# Altium footprint library Dahlia Carrier Board.PcbLib: 99 footprints (part 3 of 7)
Each footprint in its own frame and in the unit in brackets; x right, y up, seen from the top. Pads: shape width x height; smd on the part's side, far side on the other; paste and mask are expansions set on the pad; w line width, h text height; cw(c..) or ccw(c..) is an arc to the next point about the centre after c.
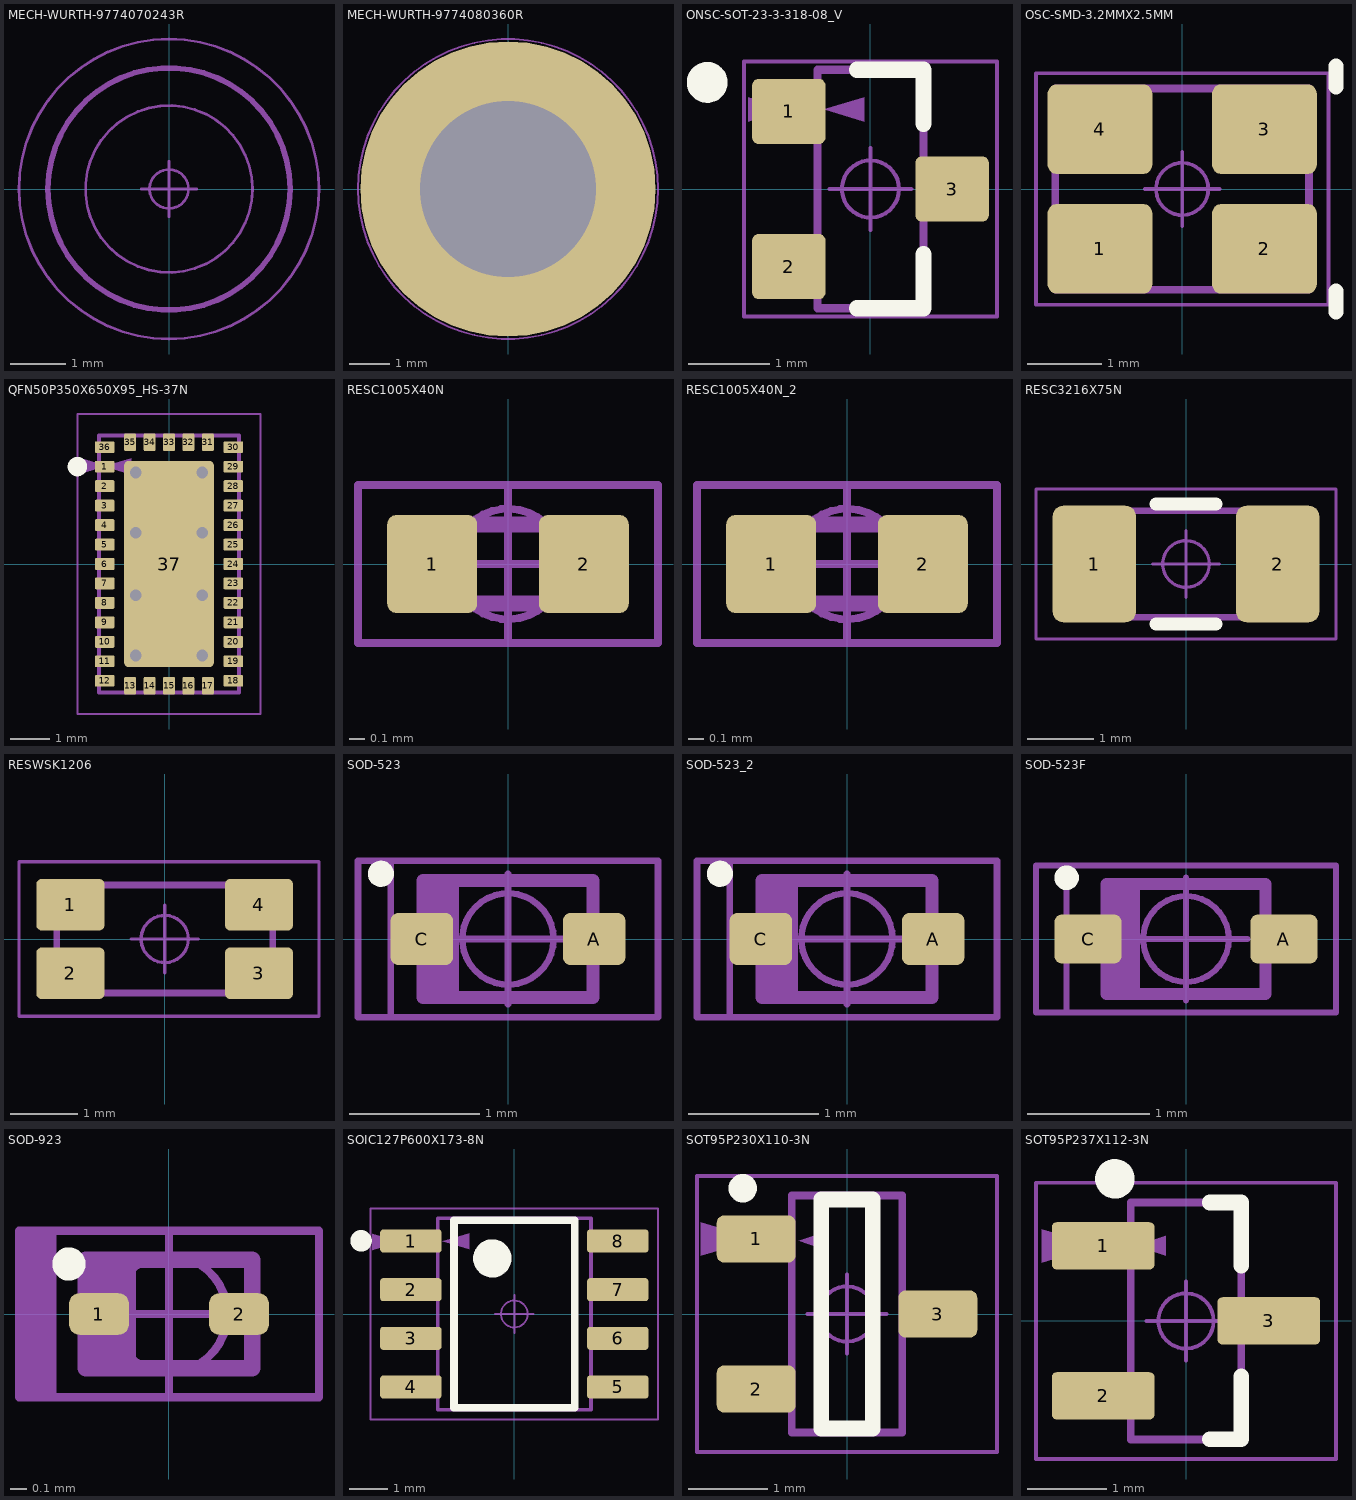
[diagram p2: the footprints below, top view; thin cyan lines are the x and y axes]

## MECH-WURTH-9774070243R [mm]
Top Component Outline:
  circle w0.05: c0,0 r2.693
  circle w0.05: c0,0 r1.499
  circle w0.05: c0,0 r2.693
  circle w0.05: c0,0 r1.499
Top 3D Body:
  circle w0.001: c0,0 r2.175
  circle w0.001: c0,0 r2.175
Top Dimensions:
  circle w0.1: c0,0 r2.175
Top Component Center:
  circle w0.05: c0,0 r0.35
  lines w0.05: -0.5,0 0.5,0 ; 0,-0.5 0,0.5
Top Assembly:
  text ".Designator" at -1.321,-0.152 h0.75
3D body "9774070243R (rev1).stp": height 7.01, standoff -1.39, extent -2.175,-2.172 2.175,2.172

## MECH-WURTH-9774080360R [mm]
pads (1):
  round 7.4 / inner round 0 / far side round 0 hole 4.4 unplated: ""(0,0)
Top Paste:
  region: 2.214,-0.4 2.177,-0.567 2.067,-0.889 1.909,-1.191 1.707,-1.466 1.466,-1.707 1.191,-1.909 0.889,-2.067 0.567,-2.177 0.4,-2.214 0.4,-3.628 0.604,-3.605 1.004,-3.514 1.391,-3.379 1.761,-3.2 2.108,-2.982 2.428,-2.725 2.717,-2.434 2.971,-2.112 3.188,-1.763 3.363,-1.393 3.496,-1.005 3.584,-0.604 3.606,-0.4
  region: 0.4,2.214 0.567,2.177 0.889,2.067 1.191,1.909 1.466,1.707 1.707,1.466 1.909,1.191 2.067,0.889 2.177,0.567 2.214,0.4 3.628,0.4 3.605,0.604 3.514,1.004 3.379,1.391 3.2,1.761 2.982,2.108 2.725,2.428 2.434,2.717 2.112,2.971 1.763,3.188 1.393,3.363 1.005,3.496 0.604,3.584 0.4,3.606
  region: -0.4,-2.214 -0.567,-2.177 -0.889,-2.067 -1.191,-1.909 -1.466,-1.707 -1.707,-1.466 -1.909,-1.191 -2.067,-0.889 -2.177,-0.567 -2.214,-0.4 -3.628,-0.4 -3.605,-0.604 -3.514,-1.004 -3.379,-1.391 -3.2,-1.761 -2.982,-2.108 -2.725,-2.428 -2.434,-2.717 -2.112,-2.971 -1.763,-3.188 -1.393,-3.363 -1.005,-3.496 -0.604,-3.584 -0.4,-3.606
  region: -2.214,0.4 -2.177,0.567 -2.067,0.889 -1.909,1.191 -1.707,1.466 -1.466,1.707 -1.191,1.909 -0.889,2.067 -0.567,2.177 -0.4,2.214 -0.4,3.628 -0.604,3.605 -1.004,3.514 -1.391,3.379 -1.761,3.2 -2.108,2.982 -2.428,2.725 -2.717,2.434 -2.971,2.112 -3.188,1.763 -3.363,1.393 -3.496,1.005 -3.584,0.604 -3.606,0.4
Top Component Outline:
  circle w0.05: c0,0 r3.759
  circle w0.05: c0,0 r2.219
Top 3D Body:
  circle w0.001: c0,0 r3
Top Dimensions:
  circle w0.1: c0,0 r3
Top Component Center:
  circle w0.05: c0,0 r0.35
  lines w0.05: -0.5,0 0.5,0 ; 0,-0.5 0,0.5
Top Assembly:
  text ".Designator" at -1.346,-0.152 h0.75
Bottom 3D Body:
  circle w0.1: c0,0 r2.24
  circle w0.1: c0,0 r3.635
3D body "9774080360R (rev1).stp": height 8, standoff -1.4, extent -3,-3 3,3

## ONSC-SOT-23-3-318-08_V [mm]
height 5.5
pads (3):
  rrect20% 0.9x0.8 smd: 1(-1,0.95) 2(-1,-0.95) 3(1,0)
Top Overlay:
  circle w0.25: c-2,1.306 r0.125
  lines w0.2: -0.165,-1.46 0.65,-1.46 0.65,-0.8 ; -0.165,1.46 0.65,1.46 0.65,0.8
Top Component Outline:
  region: -1.5,0.825 -1,0.975 -1.5,1.125
  lines w0.05: -1.55,-1.56 -1.55,1.56 1.55,1.56 1.55,-1.56 -1.55,-1.56
Top 3D Body:
  lines w0.001: -0.65,-1.46 0.65,-1.46 0.65,1.46 -0.65,1.46 -0.65,-1.46
Top Dimensions:
  region: -0.075,1.125 -0.575,0.975 -0.075,0.825
  lines w0.1: -0.65,-1.46 0.65,-1.46 0.65,1.46 -0.65,1.46 -0.65,-1.46
Top Component Center:
  circle w0.05: c0,0 r0.35
  lines w0.05: -0.5,0 0.5,0 ; 0,-0.5 0,0.5
Top Assembly:
  text ".Designator" at -1.55,1.85 h0.75
3D body "User Library-SOT-23-2.STEP": height 1.08, standoff 0, extent -1.32,-1.5 1.32,1.5

## OSC-SMD-3.2MMX2.5MM [mm]
height 5.5
pads (4):
  rrect20% 1.4x1.2 smd: 1(-1.1,-0.8) 2(1.1,-0.8) 3(1.1,0.8) 4(-1.1,0.8)
Top Overlay:
  lines w0.2: 2.057,-1.645 2.057,-1.364 ; 2.057,1.366 2.057,1.645
Top Component Outline:
  lines w0.05: -1.956,-1.549 1.956,-1.549 1.956,1.549 -1.956,1.549 -1.956,-1.549
Top 3D Body:
  lines w0.001: -1.65,-1.3 -1.65,1.3 1.65,1.3 1.65,-1.3 -1.65,-1.3
Top Dimensions:
  lines w0.1: -1.7,-1.35 -1.7,1.35 1.7,1.35 1.7,-1.35 -1.7,-1.35
Top Component Center:
  circle w0.05: c0,0 r0.35
  lines w0.05: -0.5,0 0.5,0 ; 0,-0.5 0,0.5
Top Assembly:
  text ".Designator" at 0.95,0.275 h0.75
3D body "User Library-Crystal TXC Corp 7M series.step": height 0.8, standoff 0, extent -1.65,-1.3 1.65,1.3

## QFN50P350X650X95_HS-37N [mm]
pads (37):
  rrect20% 0.5x0.3 smd paste-0.01: 1(-1.65,2.5) 2(-1.65,2) 3(-1.65,1.5) 4(-1.65,1) 5(-1.65,0.5) 6(-1.65,0) 7(-1.65,-0.5) 8(-1.65,-1) 9(-1.65,-1.5) 10(-1.65,-2) 11(-1.65,-2.5) 12(-1.65,-3) 18(1.65,-3) 30(1.65,3)
  rrect20% 0.3x0.45 smd paste-0.01: 13(-1,-3.125) 14(-0.5,-3.125) 15(0,-3.125) 16(0.5,-3.125) 17(1,-3.125) 31(1,3.125) 32(0.5,3.125) 33(0,3.125) 34(-0.5,3.125) 35(-1,3.125)
  rrect20% 0.5x0.3 smd: 19(1.65,-2.5) 20(1.65,-2) 21(1.65,-1.5) 22(1.65,-1) 23(1.65,-0.5) 24(1.65,0) 25(1.65,0.5) 26(1.65,1) 27(1.65,1.5) 28(1.65,2) 29(1.65,2.5) 36(-1.65,3)
  rrect10% 2.3x5.3 smd paste-2: 37(0,0)
via -0.85,-0.8 diameter 0.6 hole 0.3
via -0.85,0.8 diameter 0.6 hole 0.3
via 0.85,-0.8 diameter 0.6 hole 0.3
via 0.85,0.8 diameter 0.6 hole 0.3
via 0.85,-2.35 diameter 0.6 hole 0.3
via -0.85,-2.35 diameter 0.6 hole 0.3
via 0.85,2.35 diameter 0.6 hole 0.3
via -0.85,2.35 diameter 0.6 hole 0.3
Top Overlay:
  circle w0.25: c-2.35,2.5 r0.125
Top Paste:
  rectangle: -0.6,-2.351 0.6,2.349
Top Component Outline:
  region: -2.305,2.306 -1.595,2.518 -2.305,2.732
  lines w0.05: -2.35,-3.85 -2.35,3.85 2.35,3.85 2.35,-3.85 -2.35,-3.85
Top 3D Body:
  lines w0.001: -1.801,-3.301 -1.801,3.301 1.801,3.301 1.801,-3.301 -1.801,-3.301
Top Dimensions:
  region: -0.97,2.719 -1.68,2.507 -0.97,2.293
  lines w0.1: -1.8,-3.3 1.8,-3.3 1.8,3.3 -1.8,3.3 -1.8,-3.3
Top Component Center:
  circle w0.05: c0,0 r0.35
  lines w0.05: -0.5,0 0.5,0 ; 0,-0.5 0,0.5
Top Assembly:
  text ".Designator" at 0.17,-1.69 h0.75
3D body "QFN50P350X650X95_HS-37N.step": height 0.95, standoff 0, extent -1.801,-3.301 1.801,3.301

## RESC1005X40N [mm]
pads (2):
  rrect20% 0.57x0.62 smd: 1(-0.48,0) 2(0.48,0)
Top Component Outline:
  lines w0.05: -0.95,-0.5 -0.95,0.5 0.95,0.5 0.95,-0.5 -0.95,-0.5
Top 3D Body:
  lines w0.001: -0.5,-0.25 -0.5,0.25 0.5,0.25 0.5,-0.25 -0.5,-0.25
Top Dimensions:
  lines w0.1: -0.5,-0.25 -0.5,0.25 0.5,0.25 0.5,-0.25 -0.5,-0.25
Top Component Center:
  circle w0.05: c0,0 r0.35
  lines w0.05: -0.5,0 0.5,0 ; 0,-0.5 0,0.5
Top Assembly:
  text ".Designator" at -1.45,0.8 h0.75
3D body "User Library-R_0402.step": height 0.35, standoff 0, extent -0.5,-0.25 0.5,0.25

## RESC1005X40N_2 [mm]
pads (2):
  rrect20% 0.57x0.62 smd: 1(-0.48,0) 2(0.48,0)
Top Component Outline:
  lines w0.05: -0.95,-0.5 -0.95,0.5 0.95,0.5 0.95,-0.5 -0.95,-0.5
Top 3D Body:
  lines w0.001: -0.5,-0.25 -0.5,0.25 0.5,0.25 0.5,-0.25 -0.5,-0.25
Top Dimensions:
  lines w0.1: -0.5,-0.25 -0.5,0.25 0.5,0.25 0.5,-0.25 -0.5,-0.25
Top Component Center:
  circle w0.05: c0,0 r0.35
  lines w0.05: -0.5,0 0.5,0 ; 0,-0.5 0,0.5
Top Assembly:
  text ".Designator" at 0.625,0.2 h0.75
3D body "User Library-R_0402.step": height 0.35, standoff 0, extent -0.5,-0.25 0.5,0.25

## RESC3216X75N [mm]
pads (2):
  rrect25% 1.25x1.75 smd: 1(-1.375,0) 2(1.375,0)
Top Overlay:
  lines w0.2: -0.45,-0.9 0.45,-0.9 ; -0.45,0.9 0.45,0.9
Top Component Outline:
  lines w0.05: -2.25,-1.125 -2.25,1.125 2.25,1.125 2.25,-1.125 -2.25,-1.125
Top 3D Body:
  lines w0.001: -1.6,-0.8 -1.6,0.8 1.6,0.8 1.6,-0.8 -1.6,-0.8
Top Dimensions:
  lines w0.1: -1.6,-0.8 -1.6,0.8 1.6,0.8 1.6,-0.8 -1.6,-0.8
Top Component Center:
  circle w0.05: c0,0 r0.35
  lines w0.05: -0.5,0 0.5,0 ; 0,-0.5 0,0.5
Top Assembly:
  text ".Designator" at -0.835,-0.204 h0.75
3D body "User Library-R_1206.STEP": height 0.6, standoff 0, extent -1.6,-0.8 1.6,0.8

## RESWSK1206 [mil]
height 216.54
pads (4):
  rrect20% 39.76x30 smd: 1(-55,20) 2(-55,-20) 3(55,-20) 4(55,20)
Top Component Outline:
  lines w1.97: -85,-45 -85,45 90,45 90,-45 -85,-45
Top 3D Body:
  lines w0.04: -62.98,-31.49 -62.98,31.51 63,31.51 63,-31.49 -62.98,-31.49
Top Dimensions:
  lines w3.94: -62.99,-31.5 -62.99,31.5 62.99,31.5 62.99,-31.5 -62.99,-31.5
Top Component Center:
  circle w1.97: c0,0 r13.78
  lines w1.97: -19.68,0 19.68,0 ; 0,-19.68 0,19.68
Top Assembly:
  text ".Designator" at -59.06,56.1 h29.53
3D body "WSK1206.stp": height 25, standoff 0, extent -62.98,-31.49 63,31.51

## SOD-523 [mm]
pads (2):
  rrect30% 0.48x0.4 smd: A(0.66,0) C(-0.66,0)
Top Overlay:
  circle w0.1: c-0.975,0.5 r0.05
Top Component Outline:
  lines w0.05: -0.9,-0.6 -0.9,0.6 ; -1.15,-0.6 1.15,-0.6 1.15,0.6 -1.15,0.6 -1.15,-0.6
Top 3D Body:
  lines w0.001: -0.65,-0.45 -0.65,0.45 0.65,0.45 0.65,-0.45 -0.65,-0.45
Top Dimensions:
  rectangle: -0.65,-0.45 -0.375,0.45
  lines w0.1: -0.65,-0.45 0.65,-0.45 0.65,0.45 -0.65,0.45 -0.65,-0.45
Top Component Center:
  circle w0.05: c0,0 r0.35
  lines w0.05: -0.5,0 0.5,0 ; 0,-0.5 0,0.5
Top Assembly:
  text ".Designator" at -0.975,0.825 h0.75
3D body "SODFL160X70-2N.step": height 0.7, standoff 0, extent -0.8,-0.45 0.8,0.45

## SOD-523_2 [mm]
pads (2):
  rrect30% 0.48x0.4 smd: A(0.66,0) C(-0.66,0)
Top Overlay:
  circle w0.1: c-0.975,0.5 r0.05
Top Component Outline:
  lines w0.05: -0.9,-0.6 -0.9,0.6 ; -1.15,-0.6 1.15,-0.6 1.15,0.6 -1.15,0.6 -1.15,-0.6
Top 3D Body:
  lines w0.001: -0.65,-0.45 -0.65,0.45 0.65,0.45 0.65,-0.45 -0.65,-0.45
Top Dimensions:
  rectangle: -0.651,-0.45 -0.376,0.45
  lines w0.1: -0.65,-0.45 0.65,-0.45 0.65,0.45 -0.65,0.45 -0.65,-0.45
Top Component Center:
  circle w0.05: c0,0 r0.35
  lines w0.05: -0.5,0 0.5,0 ; 0,-0.5 0,0.5
Top Assembly:
  text ".Designator" at -0.625,-0.225 h0.75
3D body "SODFL160X70-2N.step": height 0.7, standoff 0, extent -0.8,-0.45 0.8,0.45

## SOD-523F [mm]
height 5.5
pads (2):
  rrect30% 0.55x0.4 smd: A(0.8,0) C(-0.8,0)
Top Overlay:
  circle w0.1: c-0.975,0.5 r0.05
Top Component Outline:
  lines w0.05: -0.975,-0.6 -0.975,0.6 ; -1.225,-0.6 1.225,-0.6 1.225,0.6 -1.225,0.6 -1.225,-0.6
Top 3D Body:
  lines w0.001: -0.65,-0.45 -0.65,0.45 0.65,0.45 0.65,-0.45 -0.65,-0.45
Top Dimensions:
  rectangle: -0.65,-0.451 -0.375,0.449
  lines w0.1: -0.65,-0.45 0.65,-0.45 0.65,0.45 -0.65,0.45 -0.65,-0.45
Top Component Center:
  circle w0.05: c0,0 r0.35
  lines w0.05: -0.5,0 0.5,0 ; 0,-0.5 0,0.5
Top Assembly:
  text ".Designator" at -0.975,0.825 h0.75
3D body "SODFL160X70-2N.step": height 0.7, standoff 0, extent -0.8,-0.45 0.8,0.45

## SOD-923 [mm] "SOD-923, 2-Leads, Body 0.60x1.00mm, IPC Medium Density"
height 0.4
pads (2):
  rrect50% 0.36x0.25 smd: 1(-0.42,0) 2(0.42,0)
Top Overlay:
  circle w0.1: c-0.6,0.3 r0.05
Top Component Outline:
  region: -0.9,0.5 -0.675,0.5 -0.675,-0.5 -0.9,-0.5
  lines w0.05: -0.9,-0.5 0.9,-0.5 0.9,0.5 -0.9,0.5 -0.9,-0.5
Top 3D Body:
  lines w0.001: -0.5,-0.325 -0.5,0.325 0.5,0.325 0.5,-0.325 -0.5,-0.325
Top Dimensions:
  region: -0.5,0.325 -0.2,0.325 -0.2,-0.325 -0.5,-0.325
  lines w0.1: -0.5,-0.325 -0.5,0.325 0.5,0.325 0.5,-0.325 -0.5,-0.325
Top Component Center:
  circle w0.05: c0,0 r0.35
  lines w0.05: -0.5,0 0.5,0 ; 0,-0.5 0,0.5
Top Assembly:
  text ".Designator" at -0.3,-0.2 h0.6
3D body "User Library-DIODE_SOD-923.STEP": height 0.43, standoff 0, extent -0.525,-0.325 0.525,0.325

## SOIC127P600X173-8N [mm]
height 13.83
pads (8):
  rrect25% 1.6x0.6 smd: 1(-2.7,1.905) 2(-2.7,0.635) 3(-2.7,-0.635) 4(-2.7,-1.905) 5(2.7,-1.905) 6(2.7,-0.635) 7(2.7,0.635) 8(2.7,1.905)
Top Overlay:
  circle w0.5: c-0.575,1.45 r0.25
  circle w0.4: c-4,1.91 r0.08
  lines w0.2: -1.575,-2.45 1.575,-2.45 1.575,2.45 -1.575,2.45 -1.575,-2.45
Top Component Outline:
  region: -3.705,1.669 -2.995,1.881 -3.705,2.095
  lines w0.05: -3.75,-2.75 3.75,-2.75 3.75,2.75 -3.75,2.75 -3.75,-2.75
Top 3D Body:
  lines w0.001: -2,-2.5 2,-2.5 2,2.5 -2,2.5 -2,-2.5
Top Dimensions:
  region: -1.175,2.113 -1.885,1.9 -1.175,1.687
  lines w0.1: -2,-2.5 2,-2.5 2,2.5 -2,2.5 -2,-2.5
Top Component Center:
  circle w0.05: c0,0 r0.35
  lines w0.05: -0.5,0 0.5,0 ; 0,-0.5 0,0.5
Top Assembly:
  text ".Designator" at -1.475,3 h0.75
3D body "User Library-SOIC127P500X620X175-8.STEP": height 1.75, standoff 0, extent -3.115,-2.5 3.115,2.5

## SOT95P230X110-3N [mm]
pads (3):
  rrect30% 1x0.6 smd: 1(-1.15,0.95) 2(-1.15,-0.95) 3(1.15,0)
Top Overlay:
  circle w0.2: c-1.321,1.593 r0.08
  lines w0.2: -0.325,-1.45 0.325,-1.45 0.325,1.45 -0.325,1.45 -0.325,-1.45
Top Component Outline:
  region: -1.85,0.737 -1.14,0.95 -1.85,1.163
  lines w0.05: -1.9,-1.75 1.9,-1.75 1.9,1.75 -1.9,1.75 -1.9,-1.75
Top 3D Body:
  lines w0.001: -0.7,-1.5 0.7,-1.5 0.7,1.5 -0.7,1.5 -0.7,-1.5
Top Dimensions:
  region: -0.61,0.925 -0.229,1.052 -0.229,0.798
  lines w0.1: -0.7,-1.5 0.7,-1.5 0.7,1.5 -0.7,1.5 -0.7,-1.5
Top Component Center:
  circle w0.05: c0,0 r0.35
  lines w0.05: -0.5,0 0.5,0 ; 0,-0.5 0,0.5
Top Assembly:
  text ".Designator" at -0.475,-0.25 h0.75
3D body "User Library-SOT-23-2.STEP": height 1.08, standoff 0, extent -1.32,-1.5 1.32,1.5

## SOT95P237X112-3N [mm]
pads (3):
  rrect20% 1.3x0.6 smd: 1(-1.05,0.95) 2(-1.05,-0.95) 3(1.05,0)
Top Overlay:
  circle w0.25: c-0.9,1.8 r0.125
  lines w0.2: 0.3,-1.5 0.7,-1.5 0.7,-0.7 ; 0.3,1.5 0.7,1.5 0.7,0.7
Top Component Outline:
  region: -1.825,0.737 -1.115,0.95 -1.825,1.163
  lines w0.05: -1.9,-1.75 -1.9,1.75 1.9,1.75 1.9,-1.75 -1.9,-1.75
Top 3D Body:
  lines w0.001: -0.7,-1.5 0.7,-1.5 0.7,1.5 -0.7,1.5 -0.7,-1.5
Top Dimensions:
  region: -0.635,0.95 -0.254,1.077 -0.254,0.823
  lines w0.1: -0.7,-1.5 -0.7,1.5 0.7,1.5 0.7,-1.5 -0.7,-1.5
Top Component Center:
  circle w0.05: c0,0 r0.35
  lines w0.05: -0.5,0 0.5,0 ; 0,-0.5 0,0.5
Top Assembly:
  text ".Designator" at -1.6,2.1 h0.75
3D body "CircuitWorks-SOT-23.step": height 1.09, standoff 0, extent -1.25,-1.5 1.25,1.5